# Altium footprint library Connectors.PcbLib: 245 footprints (part 12 of 18)
Each footprint in its own frame and in the unit in brackets; x right, y up, seen from the top. Pads: shape width x height; smd on the part's side, far side on the other; paste and mask are expansions set on the pad; w line width, h text height; cw(c..) or ccw(c..) is an arc to the next point about the centre after c.
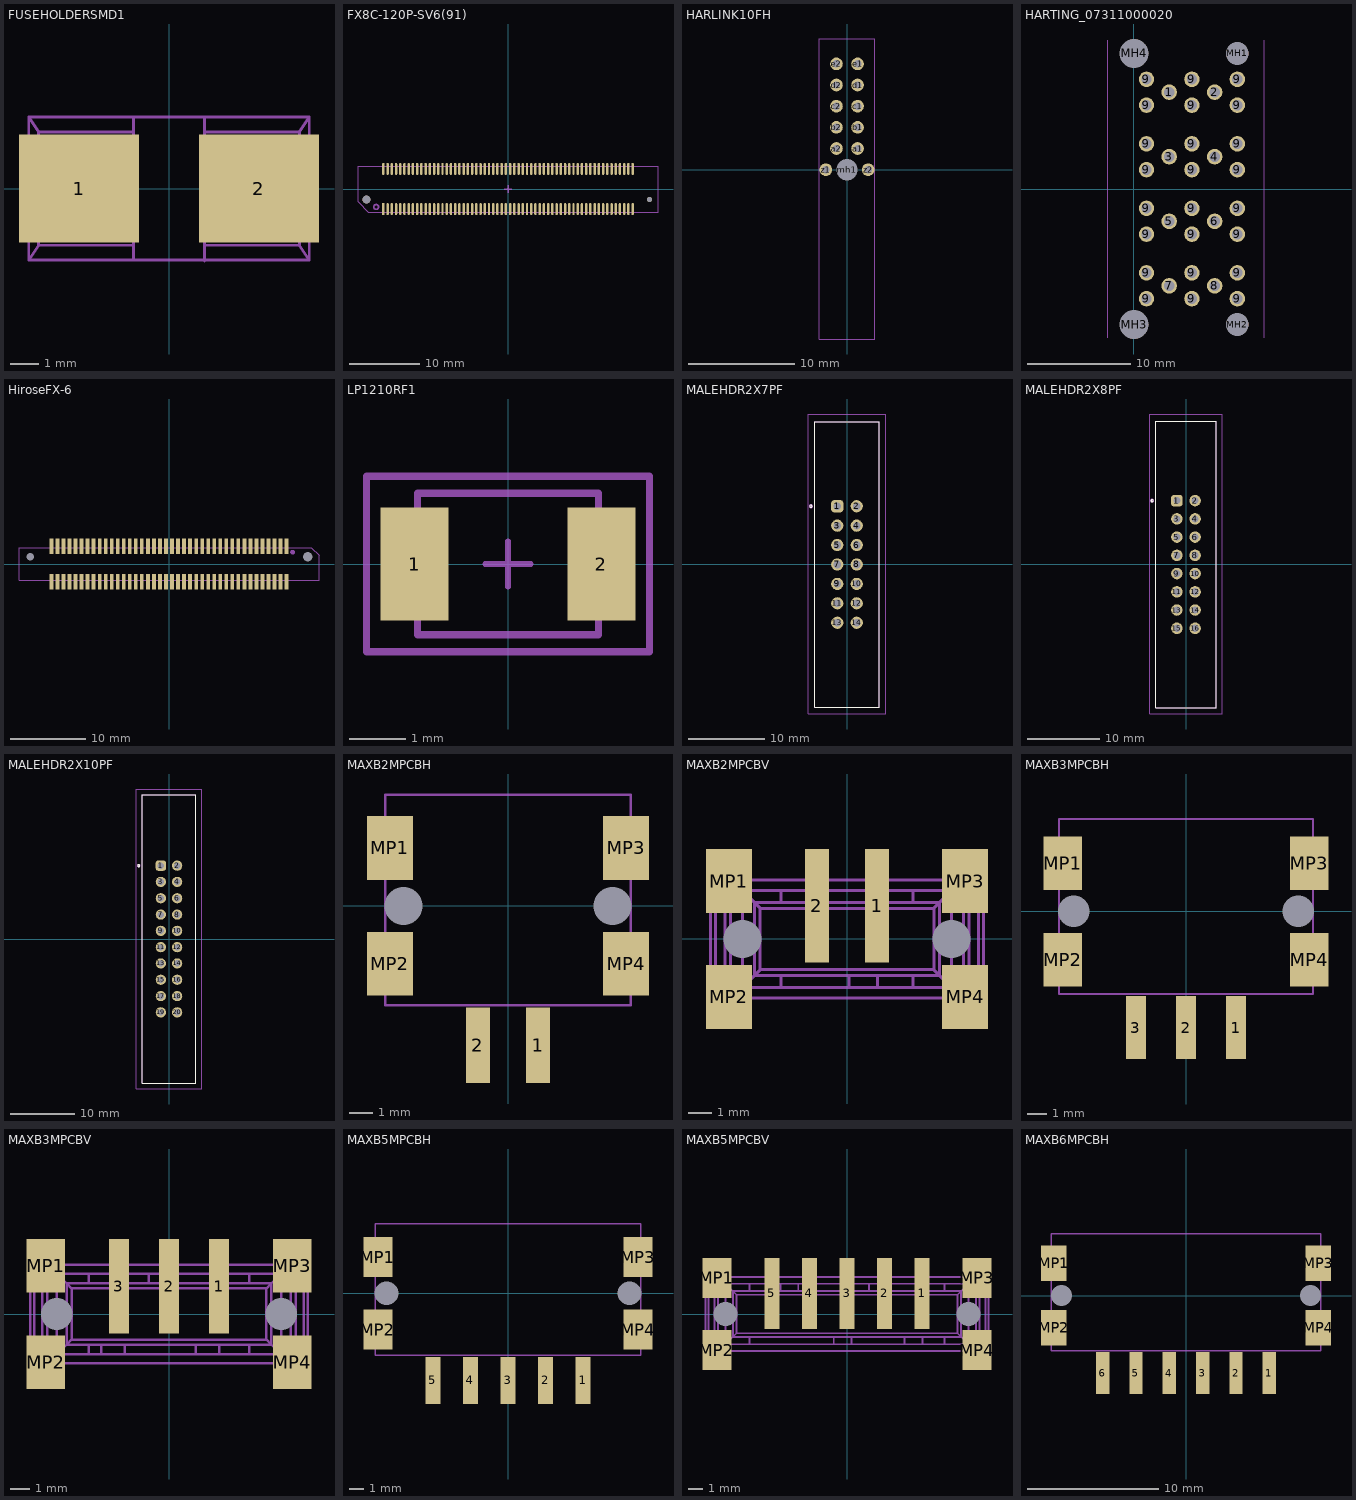
[diagram p11: the footprints below, top view; thin cyan lines are the x and y axes]

## FUSEHOLDERSMD1 [mm]
pads (2):
  rect 4.24x3.81 smd: 1(-3.175,0) 2(3.175,0)
Mechanical 13:
  lines w0.102: -1.25,-2.525 -1.25,-1.325 -3.5,-1.325 -3.5,1.325 -1.25,1.325 -1.25,2.525 ; -1.25,-2 -4.6,-2 ; -1.25,2 -4.6,2 ; 1.25,-2.55 1.25,-1.35 3.5,-1.35 3.5,1.3 1.25,1.3 1.25,2.5 ; 1.25,-2 4.6,-2 ; 1.25,2 4.6,2 ; -4.95,-2.525 -4.95,2.525 ; -4.95,-2.525 4.95,-2.525 ; -4.95,-2.525 -4.6,-2 ; -4.95,2.525 4.95,2.525 ; -4.95,2.525 -4.6,2 ; -4.6,-2 -4.6,2 ; 4.6,-2 4.6,2 ; 4.6,-2 4.95,-2.525 ; 4.6,2 4.95,2.525 ; 4.95,-2.525 4.95,2.525

## FX8C-120P-SV6(91) [mm] "Hirose 120pin Male Header SV6"
height 10.45
pads (122):
  rect 0.35x1.7 smd mask+0.076: 1(-17.7,-2.85)
  oval 0.35x1.7 smd mask+0.076: 2(-17.1,-2.85) 3(-16.5,-2.85) 4(-15.9,-2.85) 5(-15.3,-2.85) 6(-14.7,-2.85) 7(-14.1,-2.85) 8(-13.5,-2.85) 9(-12.9,-2.85) 10(-12.3,-2.85) 11(-11.7,-2.85) 12(-11.1,-2.85) 13(-10.5,-2.85) 14(-9.9,-2.85) 15(-9.3,-2.85) 16(-8.7,-2.85) 17(-8.1,-2.85) 18(-7.5,-2.85) 19(-6.9,-2.85) 20(-6.3,-2.85) 21(-5.7,-2.85) 22(-5.1,-2.85) 23(-4.5,-2.85) 24(-3.9,-2.85) 25(-3.3,-2.85) 26(-2.7,-2.85) 27(-2.1,-2.85) 28(-1.5,-2.85) 29(-0.9,-2.85) 30(-0.3,-2.85) 31(0.3,-2.85) 32(0.9,-2.85) 33(1.5,-2.85) 34(2.1,-2.85) 35(2.7,-2.85) 36(3.3,-2.85) 37(3.9,-2.85) 38(4.5,-2.85) 39(5.1,-2.85) 40(5.7,-2.85) 41(6.3,-2.85) 42(6.9,-2.85) 43(7.5,-2.85) 44(8.1,-2.85) 45(8.7,-2.85) 46(9.3,-2.85) 47(9.9,-2.85) 48(10.5,-2.85) 49(11.1,-2.85) 50(11.7,-2.85) 51(12.3,-2.85) 52(12.9,-2.85) 53(13.5,-2.85) 54(14.1,-2.85) 55(14.7,-2.85) 56(15.3,-2.85) 57(15.9,-2.85) 58(16.5,-2.85) 59(17.1,-2.85) 60(17.7,-2.85) 61(17.7,2.85) 62(17.1,2.85) 63(16.5,2.85) 64(15.9,2.85) 65(15.3,2.85) 66(14.7,2.85) 67(14.1,2.85) 68(13.5,2.85) 69(12.9,2.85) 70(12.3,2.85) 71(11.7,2.85) 72(11.1,2.85) 73(10.5,2.85) 74(9.9,2.85) 75(9.3,2.85) 76(8.7,2.85) 77(8.1,2.85) 78(7.5,2.85) 79(6.9,2.85) 80(6.3,2.85) 81(5.7,2.85) 82(5.1,2.85) 83(4.5,2.85) 84(3.9,2.85) 85(3.3,2.85) 86(2.7,2.85) 87(2.1,2.85) 88(1.5,2.85) 89(0.9,2.85) 90(0.3,2.85) 91(-0.3,2.85) 92(-0.9,2.85) 93(-1.5,2.85) 94(-2.1,2.85) 95(-2.7,2.85) 96(-3.3,2.85) 97(-3.9,2.85) 98(-4.5,2.85) 99(-5.1,2.85) 100(-5.7,2.85) 101(-6.3,2.85) 102(-6.9,2.85) 103(-7.5,2.85) 104(-8.1,2.85) 105(-8.7,2.85) 106(-9.3,2.85) 107(-9.9,2.85) 108(-10.5,2.85) 109(-11.1,2.85) 110(-11.7,2.85) 111(-12.3,2.85) 112(-12.9,2.85) 113(-13.5,2.85) 114(-14.1,2.85) 115(-14.7,2.85) 116(-15.3,2.85) 117(-15.9,2.85) 118(-16.5,2.85) 119(-17.1,2.85) 120(-17.7,2.85)
  round 1.1 hole 1.1 unplated: 121(-20.1,-1.5)
  round 0.7 hole 0.7 unplated: 122(20.1,-1.5)
Mechanical 13:
  circle w0.254: c-18.725,-2.55 r0.34
  lines w0.1: -21.3,-1.8 -21.3,3.225 21.3,3.225 21.3,-3.275 -19.825,-3.275 -21.3,-1.8
Mechanical 15:
  lines w0.2: -0.5,0 0,0 ; 0,-0.5 0,0 ; 0,0.5 0,0 ; 0.5,0 0,0
3D body: height 10.82, standoff -0.79, extent -21.3,-3.275 21.3,3.225

## HARLINK10FH [mm] "HarLink 10pin female hor."
height 11.5
pads (13):
  round 1.2 hole 0.7: a1(1,2) a2(-1,2) b1(1,4) b2(-1,4) c1(1,6) c2(-1,6) d1(1,8) d2(-1,8) e1(1,10) e2(-1,10) z1(-2,0) z2(2,0)
  round 1.9 hole 2 unplated mask+0.2: mh1(0,0)
Mechanical 13:
  lines w0.1: -2.6,-16 -2.6,12.35 2.6,12.35 2.6,-16 -2.6,-16
3D body: height 11.75, standoff -3, extent -2.899,-16 2.899,12.35

## HARTING_07311000020 [mm] "Coax conn 8ch Harting 0731 100 0020"
height 7.925
pads (36):
  round 1.5 hole 1: 1(3.45,9.375) 2(7.85,9.375) 3(3.45,3.125) 4(7.85,3.125) 5(3.45,-3.125) 6(7.85,-3.125) 7(3.45,-9.375) 8(7.85,-9.375) 9(1.25,-10.625) 9(1.25,-8.125) 9(1.25,-4.375) 9(1.25,-1.875) 9(1.25,1.875) 9(1.25,4.375) 9(1.25,8.125) 9(1.25,10.625) 9(5.65,-10.625) 9(5.65,-8.125) 9(5.65,-4.375) 9(5.65,-1.875) 9(5.65,1.875) 9(5.65,4.375) 9(5.65,8.125) 9(5.65,10.625) 9(10.05,-10.625) 9(10.05,-8.125) 9(10.05,-4.375) 9(10.05,-1.875) 9(10.05,1.875) 9(10.05,4.375) 9(10.05,8.125) 9(10.05,10.625)
  round 2.15 hole 2.2 unplated: MH1(10.05,13.125) MH2(10.05,-13.125)
  round 2.75 hole 2.8 unplated: MH3(0.05,-13.125) MH4(0.05,13.125)
Mechanical 15:
  lines w0.1: -2.5,-14.4 -2.5,14.4 ; 12.65,-14.4 12.65,14.4
  text "NO COMPONENTS HERE" at 12.35,8.8 h1
3D body: height 9, standoff -4, extent -14.85,-14.55 11.7,14.6

## HiroseFX-6 [mm] "0.8mm Pitch Stacking Height 9mm Header-Stacking Connector"
height 7
pads (82):
  rect 0.5x2 smd: 1(15.6,2.35) 2(15.6,-2.35) 3(14.8,2.35) 4(14.8,-2.35) 5(14,2.35) 6(14,-2.35) 7(13.2,2.35) 8(13.2,-2.35) 9(12.4,2.35) 10(12.4,-2.35) 11(11.6,2.35) 12(11.6,-2.35) 13(10.8,2.35) 14(10.8,-2.35) 15(10,2.35) 16(10,-2.35) 17(9.2,2.35) 18(9.2,-2.35) 19(8.4,2.35) 20(8.4,-2.35) 21(7.6,2.35) 22(7.6,-2.35) 23(6.8,2.35) 24(6.8,-2.35) 25(6,2.35) 26(6,-2.35) 27(5.2,2.35) 28(5.2,-2.35) 29(4.4,2.35) 30(4.4,-2.35) 31(3.6,2.35) 32(3.6,-2.35) 33(2.8,2.35) 34(2.8,-2.35) 35(2,2.35) 36(2,-2.35) 37(1.2,2.35) 38(1.2,-2.35) 39(0.4,2.35) 40(0.4,-2.35) 41(-0.4,2.35) 42(-0.4,-2.35) 43(-1.2,2.35) 44(-1.2,-2.35) 45(-2,2.35) 46(-2,-2.35) 47(-2.8,2.35) 48(-2.8,-2.35) 49(-3.6,2.35) 50(-3.6,-2.35) 51(-4.4,2.35) 52(-4.4,-2.35) 53(-5.2,2.35) 54(-5.2,-2.35) 55(-6,2.35) 56(-6,-2.35) 57(-6.8,2.35) 58(-6.8,-2.35) 59(-7.6,2.35) 60(-7.6,-2.35) 61(-8.4,2.35) 62(-8.4,-2.35) 63(-9.2,2.35) 64(-9.2,-2.35) 65(-10,2.35) 66(-10,-2.35) 67(-10.8,2.35) 68(-10.8,-2.35) 69(-11.6,2.35) 70(-11.6,-2.35) 71(-12.4,2.35) 72(-12.4,-2.35) 73(-13.2,2.35) 74(-13.2,-2.35) 75(-14,2.35) 76(-14,-2.35) 77(-14.8,2.35) 78(-14.8,-2.35) 79(-15.6,2.35) 80(-15.6,-2.35)
  round 0 hole 1.3 unplated: MH1(18.4,0.95)
  round 0 hole 1 unplated: MH2(-18.4,0.95)
Mechanical 13:
  circle w0.381: c16.4,1.575 r0.125
  lines w0.127: -19.9,-2.15 -19.9,2.15 18.9,2.15 19.9,1.15 19.9,-2.15 -19.9,-2.15
3D body: height 0, standoff -0.8, extent -18.859,0.491 -17.941,1.409
3D body: height 0, standoff -0.8, extent 17.788,0.338 19.012,1.562
3D body: height 4, standoff 0, extent -19.9,-2.15 19.9,2.15
3D body: height 4.01, standoff 4, extent 16.094,1.269 16.706,1.881

## LP1210RF1 [mm] "Chip capacitor 1210 (3225)"
height 2
pads (2):
  rect 1.2x2 smd: 1(-1.65,0) 2(1.65,0)
Mechanical 13:
  lines w0.127: -1.6,-1.25 1.6,-1.25 1.6,1.25 -1.6,1.25 -1.6,-1.25
Mechanical 15:
  lines w0.102: -0.4,0 0.4,0 ; 0,-0.4 0,0.4
  lines w0.127: -2.5,-1.55 -2.5,1.55 2.5,1.55 2.5,-1.55 -2.5,-1.55
3D body: height 2, standoff 0, extent -1.6,-1.25 1.6,1.25

## MALEHDR2X7PF [mm] "Male header 2x7 pin R2.54mm press fit"
height 24.7
pads (14):
  rrect50% 1.6x1.6 hole 1 paste-1.27: 1(-1.27,7.62)
  round 1.6 hole 1 paste-1.27: 2(1.27,7.62) 3(-1.27,5.08) 4(1.27,5.08) 5(-1.27,2.54) 6(1.27,2.54) 7(-1.27,0) 8(1.27,0) 9(-1.27,-2.54) 10(1.27,-2.54) 11(-1.27,-5.08) 12(1.27,-5.08) 13(-1.27,-7.62) 14(1.27,-7.62)
Top Overlay:
  circle w0.15: c-4.724,7.62 r0.152
  lines w0.127: -4.191,-18.669 -4.191,18.669 4.191,18.669 4.191,-18.669 -4.191,-18.669
Mechanical 13:
  circle w0.254: c-4.724,7.62 r0.152
  lines w0.102: -4.2,-18.66 4.2,-18.66 4.2,18.66 -4.2,18.66 -4.2,-18.66
Mechanical 15:
  lines w0.127: -5.08,-19.558 5.08,-19.558 5.08,19.685 -5.08,19.685 -5.08,-19.558
3D body: height 6, standoff 0, extent -4.2,-18.66 4.2,18.66
3D body: height 24.7, standoff 13.2, extent -1.524,11.548 1.524,18.66
3D body: height 24.7, standoff 13.2, extent -1.524,-18.66 1.524,-11.548
3D body: height 13.2, standoff 6, extent 0,-18.66 4.2,18.66
3D body: height 13.2, standoff 6, extent -4.2,2.54 0,18.66
3D body: height 13.2, standoff 6, extent -4.2,-18.66 0,-2.565
3D body: height 13.2, standoff 6, extent -1.651,7.239 -0.889,8.001
3D body: height 13.2, standoff 6, extent -1.651,4.699 -0.889,5.461
3D body: height 13.2, standoff 6, extent -1.651,2.159 -0.889,2.921
3D body: height 13.2, standoff 6, extent -1.651,-0.381 -0.889,0.381
3D body: height 13.2, standoff 6, extent -1.651,-2.921 -0.889,-2.159
3D body: height 13.2, standoff 6, extent -1.651,-5.461 -0.889,-4.699
3D body: height 13.2, standoff 6, extent -1.651,-8.001 -0.889,-7.239
3D body: height 0, standoff -4.6, extent -1.524,7.112 -1.016,8.128
3D body: height 0, standoff -4.6, extent -1.524,4.572 -1.016,5.588
3D body: height 0, standoff -4.6, extent -1.524,2.032 -1.016,3.048
3D body: height 0, standoff -4.6, extent -1.524,-0.508 -1.016,0.508
3D body: height 0, standoff -4.6, extent -1.524,-3.048 -1.016,-2.032
3D body: height 0, standoff -4.6, extent -1.524,-5.588 -1.016,-4.572
3D body: height 0, standoff -4.6, extent -1.524,-8.128 -1.016,-7.112
3D body: height 0, standoff -4.6, extent 1.016,-8.128 1.524,-7.112
3D body: height 0, standoff -4.6, extent 1.016,-5.588 1.524,-4.572
3D body: height 0, standoff -4.6, extent 1.016,-3.048 1.524,-2.032
3D body: height 0, standoff -4.6, extent 1.016,-0.508 1.524,0.508
3D body: height 0, standoff -4.6, extent 1.016,2.032 1.524,3.048
3D body: height 0, standoff -4.6, extent 1.016,4.572 1.524,5.588
3D body: height 0, standoff -4.6, extent 1.016,7.112 1.524,8.128
3D body: height 13.2, standoff 6, extent 0.889,-8.001 1.651,-7.239
3D body: height 13.2, standoff 6, extent 0.889,-5.461 1.651,-4.699
3D body: height 13.2, standoff 6, extent 0.889,-2.921 1.651,-2.159
3D body: height 13.2, standoff 6, extent 0.889,-0.381 1.651,0.381
3D body: height 13.2, standoff 6, extent 0.889,2.159 1.651,2.921
3D body: height 13.2, standoff 6, extent 0.889,4.699 1.651,5.461
3D body: height 13.2, standoff 6, extent 0.889,7.239 1.651,8.001

## MALEHDR2X8PF [mm] "Male header 2x8 pin R2.54mm press fit"
height 24.7
pads (16):
  rrect50% 1.6x1.6 hole 1 paste-1.27: 1(-1.27,8.89)
  round 1.6 hole 1 paste-1.27: 2(1.27,8.89) 3(-1.27,6.35) 4(1.27,6.35) 5(-1.27,3.81) 6(1.27,3.81) 7(-1.27,1.27) 8(1.27,1.27) 9(-1.27,-1.27) 10(1.27,-1.27) 11(-1.27,-3.81) 12(1.27,-3.81) 13(-1.27,-6.35) 14(1.27,-6.35) 15(-1.27,-8.89) 16(1.27,-8.89)
Top Overlay:
  circle w0.15: c-4.724,8.89 r0.152
  lines w0.127: -4.191,-19.939 -4.191,19.939 4.191,19.939 4.191,-19.939 -4.191,-19.939
Mechanical 13:
  circle w0.254: c-4.724,8.89 r0.152
  lines w0.102: -4.2,-19.93 4.2,-19.93 4.2,19.93 -4.2,19.93 -4.2,-19.93
Mechanical 15:
  lines w0.127: -5.08,-20.828 5.08,-20.828 5.08,20.955 -5.08,20.955 -5.08,-20.828
3D body: height 6, standoff 0, extent -4.2,-19.93 4.2,19.93
3D body: height 24.7, standoff 13.2, extent -1.524,12.818 1.524,19.93
3D body: height 24.7, standoff 13.2, extent -1.524,-19.93 1.524,-12.818
3D body: height 13.2, standoff 6, extent 0,-19.93 4.2,19.93
3D body: height 13.2, standoff 6, extent -4.2,2.54 0,19.93
3D body: height 13.2, standoff 6, extent -4.2,-19.93 0,-2.54
3D body: height 13.2, standoff 6, extent -1.651,8.509 -0.889,9.271
3D body: height 13.2, standoff 6, extent -1.651,5.969 -0.889,6.731
3D body: height 13.2, standoff 6, extent -1.651,3.429 -0.889,4.191
3D body: height 13.2, standoff 6, extent -1.651,0.889 -0.889,1.651
3D body: height 13.2, standoff 6, extent -1.651,-1.651 -0.889,-0.889
3D body: height 13.2, standoff 6, extent -1.651,-4.191 -0.889,-3.429
3D body: height 13.2, standoff 6, extent -1.651,-6.731 -0.889,-5.969
3D body: height 13.2, standoff 6, extent -1.651,-9.271 -0.889,-8.509
3D body: height 0, standoff -4.6, extent -1.524,8.382 -1.016,9.398
3D body: height 0, standoff -4.6, extent -1.524,5.842 -1.016,6.858
3D body: height 0, standoff -4.6, extent -1.524,3.302 -1.016,4.318
3D body: height 0, standoff -4.6, extent -1.524,0.762 -1.016,1.778
3D body: height 0, standoff -4.6, extent -1.524,-1.778 -1.016,-0.762
3D body: height 0, standoff -4.6, extent -1.524,-4.318 -1.016,-3.302
3D body: height 0, standoff -4.6, extent -1.524,-6.858 -1.016,-5.842
3D body: height 0, standoff -4.6, extent -1.524,-9.398 -1.016,-8.382
3D body: height 0, standoff -4.6, extent 1.016,-9.398 1.524,-8.382
3D body: height 0, standoff -4.6, extent 1.016,-6.858 1.524,-5.842
3D body: height 0, standoff -4.6, extent 1.016,-4.318 1.524,-3.302
3D body: height 0, standoff -4.6, extent 1.016,-1.778 1.524,-0.762
3D body: height 0, standoff -4.6, extent 1.016,0.762 1.524,1.778
3D body: height 0, standoff -4.6, extent 1.016,3.302 1.524,4.318
3D body: height 0, standoff -4.6, extent 1.016,5.842 1.524,6.858
3D body: height 0, standoff -4.6, extent 1.016,8.382 1.524,9.398
3D body: height 13.2, standoff 6, extent 0.889,-9.271 1.651,-8.509
3D body: height 13.2, standoff 6, extent 0.889,-6.731 1.651,-5.969
3D body: height 13.2, standoff 6, extent 0.889,-4.191 1.651,-3.429
3D body: height 13.2, standoff 6, extent 0.889,-1.651 1.651,-0.889
3D body: height 13.2, standoff 6, extent 0.889,0.889 1.651,1.651
3D body: height 13.2, standoff 6, extent 0.889,3.429 1.651,4.191
3D body: height 13.2, standoff 6, extent 0.889,5.969 1.651,6.731
3D body: height 13.2, standoff 6, extent 0.889,8.509 1.651,9.271

## MALEHDR2X10PF [mm] "Male header 2x10 pin R2.54mm press fit"
height 24.7
pads (20):
  rrect50% 1.6x1.6 hole 1 paste-1.27: 1(-1.27,11.43)
  round 1.6 hole 1 paste-1.27: 2(1.27,11.43) 3(-1.27,8.89) 4(1.27,8.89) 5(-1.27,6.35) 6(1.27,6.35) 7(-1.27,3.81) 8(1.27,3.81) 9(-1.27,1.27) 10(1.27,1.27) 11(-1.27,-1.27) 12(1.27,-1.27) 13(-1.27,-3.81) 14(1.27,-3.81) 15(-1.27,-6.35) 16(1.27,-6.35) 17(-1.27,-8.89) 18(1.27,-8.89) 19(-1.27,-11.43) 20(1.27,-11.43)
Top Overlay:
  circle w0.15: c-4.724,11.43 r0.152
  lines w0.127: -4.191,-22.479 -4.191,22.479 4.191,22.479 4.191,-22.479 -4.191,-22.479
Mechanical 13:
  circle w0.254: c-4.724,11.43 r0.152
  lines w0.102: -4.2,-22.47 4.2,-22.47 4.2,22.47 -4.2,22.47 -4.2,-22.47
Mechanical 15:
  lines w0.127: -5.08,-23.368 5.08,-23.368 5.08,23.368 -5.08,23.368 -5.08,-23.368
3D body: height 6, standoff 0, extent -4.2,-22.47 4.2,22.47
3D body: height 24.7, standoff 13.2, extent -1.524,15.24 1.524,22.352
3D body: height 24.7, standoff 13.2, extent -1.524,-22.352 1.524,-15.24
3D body: height 13.2, standoff 6, extent 0,-22.47 4.2,22.47
3D body: height 13.2, standoff 6, extent -4.2,2.54 0,22.47
3D body: height 13.2, standoff 6, extent -4.2,-22.47 0,-2.54
3D body: height 13.2, standoff 6, extent -1.651,11.049 -0.889,11.811
3D body: height 13.2, standoff 6, extent -1.651,8.509 -0.889,9.271
3D body: height 13.2, standoff 6, extent -1.651,5.969 -0.889,6.731
3D body: height 13.2, standoff 6, extent -1.651,3.429 -0.889,4.191
3D body: height 13.2, standoff 6, extent -1.651,0.889 -0.889,1.651
3D body: height 13.2, standoff 6, extent -1.651,-1.651 -0.889,-0.889
3D body: height 13.2, standoff 6, extent -1.651,-4.191 -0.889,-3.429
3D body: height 13.2, standoff 6, extent -1.651,-6.731 -0.889,-5.969
3D body: height 13.2, standoff 6, extent -1.651,-9.271 -0.889,-8.509
3D body: height 13.2, standoff 6, extent -1.651,-11.811 -0.889,-11.049
3D body: height 0, standoff -4.6, extent -1.524,10.922 -1.016,11.938
3D body: height 0, standoff -4.6, extent -1.524,8.382 -1.016,9.398
3D body: height 0, standoff -4.6, extent -1.524,5.842 -1.016,6.858
3D body: height 0, standoff -4.6, extent -1.524,3.302 -1.016,4.318
3D body: height 0, standoff -4.6, extent -1.524,0.762 -1.016,1.778
3D body: height 0, standoff -4.6, extent -1.524,-1.778 -1.016,-0.762
3D body: height 0, standoff -4.6, extent -1.524,-4.318 -1.016,-3.302
3D body: height 0, standoff -4.6, extent -1.524,-6.858 -1.016,-5.842
3D body: height 0, standoff -4.6, extent -1.524,-9.398 -1.016,-8.382
3D body: height 0, standoff -4.6, extent -1.524,-11.938 -1.016,-10.922
3D body: height 0, standoff -4.6, extent 1.016,-11.938 1.524,-10.922
3D body: height 0, standoff -4.6, extent 1.016,-9.398 1.524,-8.382
3D body: height 0, standoff -4.6, extent 1.016,-6.858 1.524,-5.842
3D body: height 0, standoff -4.6, extent 1.016,-4.318 1.524,-3.302
3D body: height 0, standoff -4.6, extent 1.016,-1.778 1.524,-0.762
3D body: height 0, standoff -4.6, extent 1.016,0.762 1.524,1.778
3D body: height 0, standoff -4.6, extent 1.016,3.302 1.524,4.318
3D body: height 0, standoff -4.6, extent 1.016,5.842 1.524,6.858
3D body: height 0, standoff -4.6, extent 1.016,8.382 1.524,9.398
3D body: height 0, standoff -4.6, extent 1.016,10.922 1.524,11.938
3D body: height 13.2, standoff 6, extent 0.889,-11.811 1.651,-11.049
3D body: height 13.2, standoff 6, extent 0.889,-9.271 1.651,-8.509
3D body: height 13.2, standoff 6, extent 0.889,-6.731 1.651,-5.969
3D body: height 13.2, standoff 6, extent 0.889,-4.191 1.651,-3.429
3D body: height 13.2, standoff 6, extent 0.889,-1.651 1.651,-0.889
3D body: height 13.2, standoff 6, extent 0.889,0.889 1.651,1.651
3D body: height 13.2, standoff 6, extent 0.889,3.429 1.651,4.191
3D body: height 13.2, standoff 6, extent 0.889,5.969 1.651,6.731
3D body: height 13.2, standoff 6, extent 0.889,8.509 1.651,9.271
3D body: height 13.2, standoff 6, extent 0.889,11.049 1.651,11.811

## MAXB2MPCBH [mm] "MaxiBridge 2 pin MALE HORIZONTAL"
height 5.05
pads (8):
  rect 1.02x3.2 smd: 1(1.27,-5.9) 2(-1.27,-5.9)
  rect 0x0 hole 1.6 unplated: MH1(-4.42,0) MH2(4.42,0)
  rect 1.95x2.7 smd: MP1(-4.995,2.45) MP2(-4.995,-2.45) MP3(4.995,2.45) MP4(4.995,-2.45)
Mechanical 13:
  lines w0.102: -5.19,-4.2 -5.19,4.7 5.19,4.7 5.19,-4.2 -5.19,-4.2
3D body: height 5.07, standoff -0.73, extent -5.77,-7.5 5.77,4.7

## MAXB2MPCBV [mm] "MaxiBridge 2 pin Male vertical"
height 9.4
pads (8):
  rect 1.02x4.8 smd: 1(1.27,1.4) 2(-1.27,1.4)
  rect 0x0 hole 1.6 unplated: MH1(-4.42,0) MH2(4.42,0)
  rect 1.95x2.7 smd: MP1(-4.995,2.45) MP2(-4.995,-2.45) MP3(4.995,2.45) MP4(4.995,-2.45)
Mechanical 13:
  lines w0.127: -5.57,-1.6 -5.77,-1.485 -5.77,-1.45 -5.77,1.45 -5.77,1.485 -5.57,1.6 ; -5.22,-2.1 -5.17,-2.109 ; -5.22,2.1 -5.17,2.109 ; -5.17,-2.391 -5.22,-2.4 -5.67,-2.4 ccw(c-5.67,-2.5) -5.77,-2.5 -5.77,-3.5 ccw(c-5.67,-3.5) -5.67,-3.6 -4.32,-3.6 ccw(c-4.32,-3.5) -4.22,-3.5 -4.22,-2.5 ; -5.17,-2.1 -5.57,-2.1 -5.57,-2 -5.57,2 -5.57,2.1 -5.17,2.1 ; -5.17,2.391 -5.22,2.4 -5.67,2.4 cw(c-5.67,2.5) -5.77,2.5 -5.77,3.5 cw(c-5.67,3.5) -5.67,3.6 -4.32,3.6 cw(c-4.32,3.5) -4.22,3.5 -4.22,2.5 ; -3.51,-1.55 0.09,-1.55 ; -1.58,2.5 -1.58,3.6 -0.96,3.6 -0.96,2.5 ; 0.09,-2.05 0.09,-1.55 ; 0.96,2.5 0.96,3.6 1.58,3.6 1.58,2.5 ; 1.29,-2.05 1.29,-1.55 ; 4.22,-2.5 4.22,-3.5 ccw(c4.32,-3.5) 4.32,-3.6 5.67,-3.6 ccw(c5.67,-3.5) 5.77,-3.5 5.77,-2.5 ccw(c5.67,-2.5) 5.67,-2.4 5.22,-2.4 5.17,-2.391 ; 4.22,2.5 4.22,3.5 cw(c4.32,3.5) 4.32,3.6 5.67,3.6 cw(c5.67,3.5) 5.77,3.5 5.77,2.5 cw(c5.67,2.5) 5.67,2.4 5.22,2.4 5.17,2.391 ; 5.17,-2.109 5.22,-2.1 ; 5.17,-2.1 5.57,-2.1 5.57,-2 5.57,2 5.57,2.1 5.17,2.1 ; 5.17,2.109 5.22,2.1 ; 5.57,-1.6 5.77,-1.485 5.77,-1.45 5.77,1.45 5.77,1.485 5.57,1.6 ; -4.92,-2.5 -4.92,2.5 ; -4.92,-2.5 4.92,-2.5 ; -4.92,-2.5 -5.17,-2.5 -5.17,2.5 -4.92,2.5 ; -4.92,2.5 4.92,2.5 ; -4.42,-2.05 -2.8,-2.05 -2.8,-1.55 -3.92,-1.55 ; -4.42,-2.05 2.8,-2.05 ; -4.42,-2.05 -4.42,2.05 ; -4.42,-2.05 -3.92,-1.55 ; -4.42,2.05 -2.8,2.05 ; -4.42,2.05 -3.92,1.55 ; -3.92,-1.55 -3.92,1.55 ; -3.92,-1.55 -3.67,-1.3 ; -3.92,1.55 -2.8,1.55 ; -3.92,1.55 -3.67,1.3 ; -3.67,-1.3 -3.67,1.3 ; -3.67,-1.3 3.67,-1.3 ; -3.67,1.3 3.67,1.3 ; -2.8,1.55 -2.8,2.05 ; -2.8,1.55 2.8,1.55 ; -2.8,2.05 2.8,2.05 ; 0.09,-1.55 1.29,-1.55 ; 1.29,-1.55 2.8,-1.55 ; 2.8,-2.05 4.42,-2.05 ; 2.8,-2.05 2.8,-1.55 ; 2.8,-1.55 3.92,-1.55 ; 2.8,1.55 3.92,1.55 ; 2.8,1.55 2.8,2.05 ; 2.8,2.05 4.42,2.05 ; 3.67,-1.3 3.67,1.3 ; 3.67,-1.3 3.92,-1.55 ; 3.67,1.3 3.92,1.55 ; 3.92,-1.55 3.92,1.55 ; 3.92,-1.55 4.42,-2.05 ; 3.92,1.55 4.42,2.05 ; 4.42,-2.05 4.42,2.05 ; 4.92,-2.5 4.92,2.5 ; 4.92,-2.5 5.17,-2.5 5.17,2.5 4.92,2.5 ; -1.58,-0.76 -1.58,1.16 -0.96,1.16 -0.96,-0.76 -1.58,-0.76 ; 0.96,-0.76 0.96,1.16 1.58,1.16 1.58,-0.76 0.96,-0.76
3D body: height 9.42, standoff -0.73, extent -5.77,-3.6 5.77,3.6

## MAXB3MPCBH [mm] "MaxiBridge 3 pin MALE HORIZONTAL"
height 5.05
pads (9):
  rect 1.02x3.2 smd: 1(2.54,-5.9) 2(0,-5.9) 3(-2.54,-5.9)
  rect 0x0 hole 1.6 unplated: MH1(-5.69,0) MH2(5.69,0)
  rect 1.95x2.7 smd: MP1(-6.265,2.45) MP2(-6.265,-2.45) MP3(6.265,2.45) MP4(6.265,-2.45)
Mechanical 13:
  lines w0.102: -6.46,-4.2 -6.46,4.7 6.46,4.7 6.46,-4.2 -6.451,-4.2
3D body: height 5.07, standoff -0.73, extent -7.04,-7.5 7.04,4.7

## MAXB3MPCBV [mm] "MaxiBridge 3 pin Male vertical"
height 9.4
pads (9):
  rect 1.02x4.8 smd: 1(2.54,1.4) 2(0,1.4) 3(-2.54,1.4)
  rect 0x0 hole 1.6 unplated: MH1(-5.69,0) MH2(5.69,0)
  rect 1.95x2.7 smd: MP1(-6.265,2.45) MP2(-6.265,-2.45) MP3(6.265,2.45) MP4(6.265,-2.45)
Mechanical 13:
  lines w0.127: -6.84,-1.6 -7.04,-1.485 -7.04,-1.45 -7.04,1.45 -7.04,1.485 -6.84,1.6 ; -6.49,-2.1 -6.44,-2.109 ; -6.49,2.1 -6.44,2.109 ; -6.44,-2.391 -6.49,-2.4 -6.94,-2.4 ccw(c-6.94,-2.5) -7.04,-2.5 -7.04,-3.5 ccw(c-6.94,-3.5) -6.94,-3.6 -5.59,-3.6 ccw(c-5.59,-3.5) -5.49,-3.5 -5.49,-2.5 ; -6.44,-2.1 -6.84,-2.1 -6.84,-2 -6.84,2 -6.84,2.1 -6.44,2.1 ; -6.44,2.391 -6.49,2.4 -6.94,2.4 cw(c-6.94,2.5) -7.04,2.5 -7.04,3.5 cw(c-6.94,3.5) -6.94,3.6 -5.59,3.6 cw(c-5.59,3.5) -5.49,3.5 -5.49,2.5 ; -5.715,2.05 4.07,2.05 ; -3.44,-2.05 -3.44,-1.55 ; -2.85,2.5 -2.85,3.6 -2.23,3.6 -2.23,2.5 ; -2.24,-2.05 -2.24,-1.55 ; -2.24,2.05 -2.24,1.55 ; -1.04,2.05 -1.04,1.55 ; -0.31,2.5 -0.31,3.6 0.31,3.6 0.31,2.5 ; 1.36,-2.05 1.36,-1.55 ; 2.23,2.5 2.23,3.6 2.85,3.6 2.85,2.5 ; 2.56,-2.05 2.56,-1.55 ; 5.49,-2.5 5.49,-3.5 ccw(c5.59,-3.5) 5.59,-3.6 6.94,-3.6 ccw(c6.94,-3.5) 7.04,-3.5 7.04,-2.5 ccw(c6.94,-2.5) 6.94,-2.4 6.49,-2.4 6.44,-2.391 ; 5.49,2.5 5.49,3.5 cw(c5.59,3.5) 5.59,3.6 6.94,3.6 cw(c6.94,3.5) 7.04,3.5 7.04,2.5 cw(c6.94,2.5) 6.94,2.4 6.49,2.4 6.44,2.391 ; 6.44,-2.109 6.49,-2.1 ; 6.44,-2.1 6.84,-2.1 6.84,-2 6.84,2 6.84,2.1 6.44,2.1 ; 6.44,2.109 6.49,2.1 ; 6.84,-1.6 7.04,-1.485 7.04,-1.45 7.04,1.45 7.04,1.485 6.84,1.6 ; -6.19,-2.5 -6.44,-2.5 -6.44,2.5 -6.19,2.5 ; -6.19,-2.5 6.19,-2.5 ; -6.19,-2.5 -6.19,2.5 ; -6.19,2.5 6.19,2.5 ; -5.69,-2.05 -5.19,-1.55 ; -5.69,-2.05 -5.69,2.05 ; -5.69,-2.05 4.07,-2.05 ; -5.69,-2.05 -4.07,-2.05 -4.07,-1.55 ; -5.69,2.05 -5.19,1.55 ; -5.69,2.05 -4.07,2.05 -4.07,1.55 ; -5.19,-1.55 -4.94,-1.3 ; -5.19,-1.55 -4.07,-1.55 ; -5.19,-1.55 -5.19,1.55 ; -5.19,1.55 -4.94,1.3 ; -5.19,1.55 -4.07,1.55 ; -4.94,-1.3 4.94,-1.3 ; -4.94,-1.3 -4.94,1.3 ; -4.94,1.3 4.94,1.3 ; -4.07,-1.55 -3.44,-1.55 ; -4.07,1.55 -2.24,1.55 ; -3.44,-1.55 -2.24,-1.55 ; -2.24,-1.55 1.36,-1.55 ; -2.24,1.55 -1.04,1.55 ; -1.04,1.55 4.07,1.55 ; 1.36,-1.55 2.56,-1.55 ; 2.56,-1.55 4.07,-1.55 ; 4.07,-2.05 4.07,-1.55 ; 4.07,-2.05 5.69,-2.05 ; 4.07,-1.55 5.19,-1.55 ; 4.07,1.55 4.07,2.05 ; 4.07,1.55 5.19,1.55 ; 4.07,2.05 5.69,2.05 ; 4.94,-1.3 5.19,-1.55 ; 4.94,-1.3 4.94,1.3 ; 4.94,1.3 5.19,1.55 ; 5.19,-1.55 5.69,-2.05 ; 5.19,-1.55 5.19,1.55 ; 5.19,1.55 5.69,2.05 ; 5.69,-2.05 5.69,2.05 ; 6.19,-2.5 6.44,-2.5 6.44,2.5 6.19,2.5 ; 6.19,-2.5 6.19,2.5 ; -2.85,-0.76 -2.85,1.16 -2.23,1.16 -2.23,-0.76 -2.85,-0.76 ; -0.31,-0.76 0.31,-0.76 0.31,1.16 -0.31,1.16 -0.31,-0.76 ; 2.23,-0.76 2.85,-0.76 2.85,1.16 2.23,1.16 2.23,-0.76
3D body: height 9.42, standoff -0.73, extent -7.04,-3.6 7.04,3.6

## MAXB5MPCBH [mm] "MaxiBridge 5 pin MALE HORIZONTAL"
height 5.05
pads (11):
  rect 1.02x3.2 smd: 1(5.08,-5.9) 2(2.54,-5.9) 3(0,-5.9) 4(-2.54,-5.9) 5(-5.08,-5.9)
  rect 0x0 hole 1.6 unplated: MH1(-8.23,0) MH2(8.23,0)
  rect 1.95x2.7 smd: MP1(-8.805,2.45) MP2(-8.805,-2.45) MP3(8.805,2.45) MP4(8.805,-2.45)
Mechanical 13:
  lines w0.102: -9,-4.2 9,-4.2 9,4.7 -9,4.7 -9,-4.2
3D body: height 5.07, standoff -0.73, extent -9.58,-7.5 9.58,4.7

## MAXB5MPCBV [mm] "MaxiBridge 5 pin Male vertical"
height 9.4
pads (11):
  rect 1.02x4.8 smd: 1(5.08,1.4) 2(2.54,1.4) 3(0,1.4) 4(-2.54,1.4) 5(-5.08,1.4)
  rect 0x0 hole 1.6 unplated: MH1(-8.23,0) MH2(8.23,0)
  rect 1.95x2.7 smd: MP1(-8.805,2.45) MP2(-8.805,-2.45) MP3(8.805,2.45) MP4(8.805,-2.45)
Mechanical 13:
  lines w0.127: -9.38,-1.6 -9.58,-1.485 -9.58,-1.45 -9.58,1.45 -9.58,1.485 -9.38,1.6 ; -9.03,-2.1 -8.98,-2.109 ; -9.03,2.1 -8.98,2.109 ; -8.98,-2.391 -9.03,-2.4 -9.48,-2.4 ccw(c-9.48,-2.5) -9.58,-2.5 -9.58,-3.5 ccw(c-9.48,-3.5) -9.48,-3.6 -8.13,-3.6 ccw(c-8.13,-3.5) -8.03,-3.5 -8.03,-2.5 ; -8.98,-2.1 -9.38,-2.1 -9.38,-2 -9.38,2 -9.38,2.1 -8.98,2.1 ; -8.98,2.391 -9.03,2.4 -9.48,2.4 cw(c-9.48,2.5) -9.58,2.5 -9.58,3.5 cw(c-9.48,3.5) -9.48,3.6 -8.13,3.6 cw(c-8.13,3.5) -8.03,3.5 -8.03,2.5 ; -5.39,2.5 -5.39,3.6 -4.77,3.6 -4.77,2.5 ; -4.5,2.05 -4.5,1.55 ; -3.3,2.05 -3.3,1.55 ; -2.85,2.5 -2.85,3.6 -2.23,3.6 -2.23,2.5 ; -0.9,-2.05 -0.9,-1.55 ; -0.31,2.5 -0.31,3.6 0.31,3.6 0.31,2.5 ; 0.3,-2.05 0.3,-1.55 ; 0.3,2.05 0.3,1.55 ; 1.5,2.05 1.5,1.55 ; 2.23,2.5 2.23,3.6 2.85,3.6 2.85,2.5 ; 3.9,-2.05 3.9,-1.55 ; 4.77,2.5 4.77,3.6 5.39,3.6 5.39,2.5 ; 5.1,-2.05 5.1,-1.55 ; 8.03,-2.5 8.03,-3.5 ccw(c8.13,-3.5) 8.13,-3.6 9.48,-3.6 ccw(c9.48,-3.5) 9.58,-3.5 9.58,-2.5 ccw(c9.48,-2.5) 9.48,-2.4 9.03,-2.4 8.98,-2.391 ; 8.03,2.5 8.03,3.5 cw(c8.13,3.5) 8.13,3.6 9.48,3.6 cw(c9.48,3.5) 9.58,3.5 9.58,2.5 cw(c9.48,2.5) 9.48,2.4 9.03,2.4 8.98,2.391 ; 8.98,-2.109 9.03,-2.1 ; 8.98,-2.1 9.38,-2.1 9.38,-2 9.38,2 9.38,2.1 8.98,2.1 ; 8.98,2.109 9.03,2.1 ; 9.38,-1.6 9.58,-1.485 9.58,-1.45 9.58,1.45 9.58,1.485 9.38,1.6 ; -8.73,-2.5 -8.73,2.5 ; -8.73,-2.5 8.73,-2.5 ; -8.73,-2.5 -8.98,-2.5 -8.98,2.5 -8.73,2.5 ; -8.73,2.5 8.73,2.5 ; -8.23,-2.05 -6.61,-2.05 ; -8.23,-2.05 -8.23,2.05 ; -8.23,-2.05 -7.73,-1.55 ; -8.23,2.05 -6.61,2.05 ; -8.23,2.05 -7.73,1.55 ; -7.73,-1.55 -7.73,1.55 ; -7.73,-1.55 -6.61,-1.55 ; -7.73,-1.55 -7.48,-1.3 ; -7.73,1.55 -6.61,1.55 ; -7.73,1.55 -7.48,1.3 ; -7.48,-1.3 -7.48,1.3 ; -7.48,-1.3 7.48,-1.3 ; -7.48,1.3 7.48,1.3 ; -6.61,-2.05 6.61,-2.05 ; -6.61,-2.05 -6.61,-1.55 ; -6.61,-1.55 -0.9,-1.55 ; -6.61,1.55 -6.61,2.05 ; -6.61,1.55 -4.5,1.55 ; -6.61,2.05 6.61,2.05 ; -4.5,1.55 -3.3,1.55 ; -3.3,1.55 0.3,1.55 ; -0.9,-1.55 0.3,-1.55 ; 0.3,-1.55 3.9,-1.55 ; 0.3,1.55 1.5,1.55 ; 1.5,1.55 6.61,1.55 ; 3.9,-1.55 5.1,-1.55 ; 5.1,-1.55 6.61,-1.55 ; 6.61,-2.05 8.23,-2.05 ; 6.61,-2.05 6.61,-1.55 ; 6.61,-1.55 7.73,-1.55 ; 6.61,1.55 7.73,1.55 ; 6.61,1.55 6.61,2.05 ; 6.61,2.05 8.23,2.05 ; 7.48,-1.3 7.48,1.3 ; 7.48,-1.3 7.73,-1.55 ; 7.48,1.3 7.73,1.55 ; 7.73,-1.55 7.73,1.55 ; 7.73,-1.55 8.23,-2.05 ; 7.73,1.55 8.23,2.05 ; 8.23,-2.05 8.23,2.05 ; 8.73,-2.5 8.73,2.5 ; 8.73,-2.5 8.98,-2.5 8.98,2.5 8.73,2.5 ; -5.39,-0.76 -5.39,1.16 -4.77,1.16 -4.77,-0.76 -5.39,-0.76 ; -2.85,-0.76 -2.85,1.16 -2.23,1.16 -2.23,-0.76 -2.85,-0.76 ; -0.31,-0.76 0.31,-0.76 0.31,1.16 -0.31,1.16 -0.31,-0.76 ; 2.23,-0.76 2.23,1.16 2.85,1.16 2.85,-0.76 2.23,-0.76 ; 4.77,-0.76 4.77,1.16 5.39,1.16 5.39,-0.76 4.77,-0.76
3D body: height 9.42, standoff -0.73, extent -9.58,-3.6 9.58,3.6

## MAXB6MPCBH [mm] "MaxiBridge 6 pin MALE HORIZONTAL"
height 5.05
pads (12):
  rect 1.02x3.2 smd: 1(6.35,-5.9) 2(3.81,-5.9) 3(1.27,-5.9) 4(-1.27,-5.9) 5(-3.81,-5.9) 6(-6.35,-5.9)
  rect 0x0 hole 1.6 unplated: MH1(-9.5,0) MH2(9.5,0)
  rect 1.95x2.7 smd: MP1(-10.075,2.45) MP2(-10.075,-2.45) MP3(10.075,2.45) MP4(10.075,-2.45)
Mechanical 13:
  lines w0.102: -10.27,-4.2 -10.27,4.7 10.27,4.7 10.27,-4.2 -10.27,-4.2
3D body: height 6.12, standoff -1.08, extent -10.85,-5.45 10.85,4.7